# Altium schematic symbol library jlcpcb_2025_04_capacitors_extended_0402.schlib: 3594 symbols (part 19 of 20) (continued)
## UMK105CG471JVHF
designator C?  Capacitance: 470pF  (hidden comment: *)
Capacitor, Ceramic (MLCC), 470pF, ±5%, 50V, C0G, ±5%, SMD 0402; Manufacturer: Taiyo Yuden; Manufacturer Part Number: UMK105CG471JVHF; Package Size: 0402; JLCPCB Basic Part: No; JLCPCB Part Number: C650946; Supplier 1: LCSC; Category: Capacitors - MLCC; Supplier Part Number 1: C650946; Tolerance: ±5%; Voltage Rating: 50V; Temperature Coefficient: C0G; RoHS: Yes; ComponentLink1Description: Datasheet; ComponentLink1URL: https://wmsc.lcsc.com/wmsc/upload/file/pdf/v2/lcsc/2304140030_Taiyo-Yuden-UMK105CG471JVHF_C650946.pdf; ComponentLink2Description: JLCPCB Part URL; ComponentLink2URL: https://jlcpcb.com/partdetail/C650946; ComponentLink3Description: LCSC Part URL; ComponentLink3URL: https://lcsc.com/product-detail/Multilayer-Ceramic-Capacitors-MLCC---SMD-SMT_Taiyo-Yuden-Taiyo-Yuden-UMK105CG471JVHF_C650946.html
footprint CAP-0402 (0402 (1005M) Capacitor)
pins: 1, 2

## UMK105CG560JV-F
designator C?  Capacitance: 56pF  (hidden comment: *)
Capacitor, Ceramic (MLCC), 56pF, ±5%, 50V, C0G, ±5%, SMD 0402; Manufacturer: Taiyo Yuden; Manufacturer Part Number: UMK105CG560JV-F; Package Size: 0402; JLCPCB Basic Part: No; JLCPCB Part Number: C386143; Supplier 1: LCSC; Category: Capacitors - MLCC; Supplier Part Number 1: C386143; Tolerance: ±5%; Voltage Rating: 50V; Temperature Coefficient: C0G; RoHS: Yes; ComponentLink1Description: Datasheet; ComponentLink1URL: https://wmsc.lcsc.com/wmsc/upload/file/pdf/v2/lcsc/2304140030_Taiyo-Yuden-UMK105CG560JV-F_C386143.pdf; ComponentLink2Description: JLCPCB Part URL; ComponentLink2URL: https://jlcpcb.com/partdetail/C386143; ComponentLink3Description: LCSC Part URL; ComponentLink3URL: https://lcsc.com/product-detail/Multilayer-Ceramic-Capacitors-MLCC---SMD-SMT_Taiyo-Yuden-Taiyo-Yuden-UMK105CG560JV-F_C386143.html
footprint CAP-0402 (0402 (1005M) Capacitor)
pins: 1, 2

## UMK105CG561JVHF
designator C?  Capacitance: 560pF  (hidden comment: *)
Capacitor, Ceramic (MLCC), 560pF, ±5%, 50V, C0G, ±5%, SMD 0402; Manufacturer: Taiyo Yuden; Manufacturer Part Number: UMK105CG561JVHF; Package Size: 0402; JLCPCB Basic Part: No; JLCPCB Part Number: C2987844; Supplier 1: LCSC; Category: Capacitors - MLCC; Supplier Part Number 1: C2987844; Tolerance: ±5%; Voltage Rating: 50V; Temperature Coefficient: C0G; RoHS: Yes; ComponentLink1Description: Datasheet; ComponentLink1URL: https://wmsc.lcsc.com/wmsc/upload/file/pdf/v2/lcsc/2203311630_Taiyo-Yuden-UMK105CG561JVHF_C2987844.pdf; ComponentLink2Description: JLCPCB Part URL; ComponentLink2URL: https://jlcpcb.com/partdetail/C2987844; ComponentLink3Description: LCSC Part URL; ComponentLink3URL: https://lcsc.com/product-detail/Multilayer-Ceramic-Capacitors-MLCC---SMD-SMT_Taiyo-Yuden-Taiyo-Yuden-UMK105CG561JVHF_C2987844.html
footprint CAP-0402 (0402 (1005M) Capacitor)
pins: 1, 2

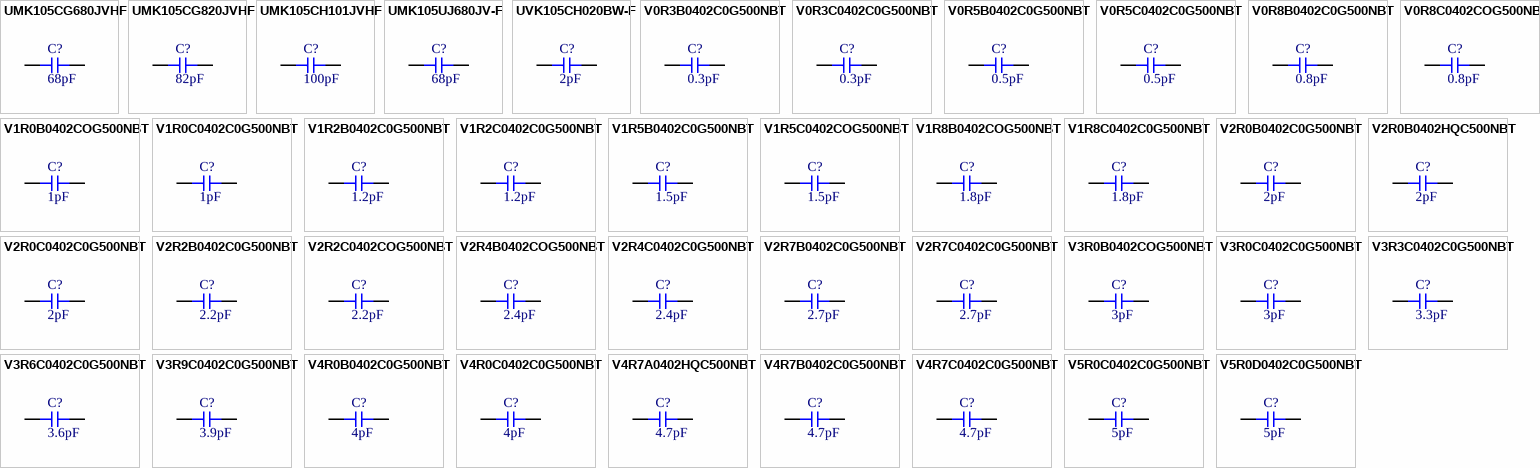
[diagram p87: symbols UMK105CG680JVHF to V5R0D0402C0G500NBT]

## UMK105CG680JVHF
designator C?  Capacitance: 68pF  (hidden comment: *)
Capacitor, Ceramic (MLCC), 68pF, ±5%, 50V, C0G, ±5%, SMD 0402; Manufacturer: Taiyo Yuden; Manufacturer Part Number: UMK105CG680JVHF; Package Size: 0402; JLCPCB Basic Part: No; JLCPCB Part Number: C2180891; Supplier 1: LCSC; Category: Capacitors - MLCC; Supplier Part Number 1: C2180891; Tolerance: ±5%; Voltage Rating: 50V; Temperature Coefficient: C0G; RoHS: Yes; ComponentLink1Description: Datasheet; ComponentLink1URL: https://wmsc.lcsc.com/wmsc/upload/file/pdf/v2/lcsc/2309051423_Taiyo-Yuden-UMK105CG680JVHF_C2180891.pdf; ComponentLink2Description: JLCPCB Part URL; ComponentLink2URL: https://jlcpcb.com/partdetail/C2180891; ComponentLink3Description: LCSC Part URL; ComponentLink3URL: https://lcsc.com/product-detail/Multilayer-Ceramic-Capacitors-MLCC---SMD-SMT_Taiyo-Yuden-Taiyo-Yuden-UMK105CG680JVHF_C2180891.html
footprint CAP-0402 (0402 (1005M) Capacitor)
pins: 1, 2

## UMK105CG820JVHF
designator C?  Capacitance: 82pF  (hidden comment: *)
Capacitor, Ceramic (MLCC), 82pF, ±5%, 50V, C0G, ±5%, SMD 0402; Manufacturer: Taiyo Yuden; Manufacturer Part Number: UMK105CG820JVHF; Package Size: 0402; JLCPCB Basic Part: No; JLCPCB Part Number: C650992; Supplier 1: LCSC; Category: Capacitors - MLCC; Supplier Part Number 1: C650992; Tolerance: ±5%; Voltage Rating: 50V; Temperature Coefficient: C0G; RoHS: Yes; ComponentLink1Description: Datasheet; ComponentLink1URL: https://wmsc.lcsc.com/wmsc/upload/file/pdf/v2/lcsc/2304140030_Taiyo-Yuden-UMK105CG820JVHF_C650992.pdf; ComponentLink2Description: JLCPCB Part URL; ComponentLink2URL: https://jlcpcb.com/partdetail/C650992; ComponentLink3Description: LCSC Part URL; ComponentLink3URL: https://lcsc.com/product-detail/Multilayer-Ceramic-Capacitors-MLCC---SMD-SMT_Taiyo-Yuden-Taiyo-Yuden-UMK105CG820JVHF_C650992.html
footprint CAP-0402 (0402 (1005M) Capacitor)
pins: 1, 2

## UMK105CH101JVHF
designator C?  Capacitance: 100pF  (hidden comment: *)
Capacitor, Ceramic (MLCC), 100pF, ±5%, 50V, ±5%, SMD 0402; Manufacturer: Taiyo Yuden; Manufacturer Part Number: UMK105CH101JVHF; Package Size: 0402; JLCPCB Basic Part: No; JLCPCB Part Number: C386148; Supplier 1: LCSC; Category: Capacitors - MLCC; Supplier Part Number 1: C386148; Tolerance: ±5%; Voltage Rating: 50V; RoHS: Yes; ComponentLink1Description: Datasheet; ComponentLink1URL: https://wmsc.lcsc.com/wmsc/upload/file/pdf/v2/lcsc/2304140030_Taiyo-Yuden-UMK105CH101JVHF_C386148.pdf; ComponentLink2Description: JLCPCB Part URL; ComponentLink2URL: https://jlcpcb.com/partdetail/C386148; ComponentLink3Description: LCSC Part URL; ComponentLink3URL: https://lcsc.com/product-detail/Multilayer-Ceramic-Capacitors-MLCC---SMD-SMT_Taiyo-Yuden-Taiyo-Yuden-UMK105CH101JVHF_C386148.html
footprint CAP-0402 (0402 (1005M) Capacitor)
pins: 1, 2

## UMK105UJ680JV-F
designator C?  Capacitance: 68pF  (hidden comment: *)
Capacitor, Ceramic (MLCC), 68pF, ±5%, 50V, U2J, ±5%, SMD 0402; Manufacturer: Taiyo Yuden; Manufacturer Part Number: UMK105UJ680JV-F; Package Size: 0402; JLCPCB Basic Part: No; JLCPCB Part Number: C311714; Supplier 1: LCSC; Category: Capacitors - MLCC; Supplier Part Number 1: C311714; Tolerance: ±5%; Voltage Rating: 50V; Temperature Coefficient: U2J; RoHS: Yes; ComponentLink1Description: Datasheet; ComponentLink1URL: https://wmsc.lcsc.com/wmsc/upload/file/pdf/v2/lcsc/2304140030_Taiyo-Yuden-UMK105UJ680JV-F_C311714.pdf; ComponentLink2Description: JLCPCB Part URL; ComponentLink2URL: https://jlcpcb.com/partdetail/C311714; ComponentLink3Description: LCSC Part URL; ComponentLink3URL: https://lcsc.com/product-detail/Multilayer-Ceramic-Capacitors-MLCC---SMD-SMT_Taiyo-Yuden-Taiyo-Yuden-UMK105UJ680JV-F_C311714.html
footprint CAP-0402 (0402 (1005M) Capacitor)
pins: 1, 2

## UVK105CH020BW-F
designator C?  Capacitance: 2pF  (hidden comment: *)
Capacitor, Ceramic (MLCC), 2pF, 50V, C0H, SMD 0402; Manufacturer: Taiyo Yuden; Manufacturer Part Number: UVK105CH020BW-F; Package Size: 0402; JLCPCB Basic Part: No; JLCPCB Part Number: C454119; Supplier 1: LCSC; Category: Capacitors - MLCC; Supplier Part Number 1: C454119; Voltage Rating: 50V; Temperature Coefficient: C0H; RoHS: Yes; ComponentLink1Description: Datasheet; ComponentLink1URL: https://wmsc.lcsc.com/wmsc/upload/file/pdf/v2/lcsc/2211282230_Taiyo-Yuden-UVK105CH020BW-F_C454119.pdf; ComponentLink2Description: JLCPCB Part URL; ComponentLink2URL: https://jlcpcb.com/partdetail/C454119; ComponentLink3Description: LCSC Part URL; ComponentLink3URL: https://lcsc.com/product-detail/Multilayer-Ceramic-Capacitors-MLCC---SMD-SMT_Taiyo-Yuden-Taiyo-Yuden-UVK105CH020BW-F_C454119.html
footprint CAP-0402 (0402 (1005M) Capacitor)
pins: 1, 2

## V0R3B0402C0G500NBT
designator C?  Capacitance: 0.3pF  (hidden comment: *)
Capacitor, Ceramic (MLCC), 0.3pF, 50V, C0G, SMD 0402; Manufacturer: VIIYONG; Manufacturer Part Number: V0R3B0402C0G500NBT; Package Size: 0402; JLCPCB Basic Part: No; JLCPCB Part Number: C610035; Supplier 1: LCSC; Category: Capacitors - MLCC; Supplier Part Number 1: C610035; Voltage Rating: 50V; Temperature Coefficient: C0G; RoHS: Yes; ComponentLink1Description: Datasheet; ComponentLink1URL: https://wmsc.lcsc.com/wmsc/upload/file/pdf/v2/lcsc/2304140030_VIIYONG-V0R3B0402C0G500NBT_C610035.pdf; ComponentLink2Description: JLCPCB Part URL; ComponentLink2URL: https://jlcpcb.com/partdetail/C610035; ComponentLink3Description: LCSC Part URL; ComponentLink3URL: https://lcsc.com/product-detail/Multilayer-Ceramic-Capacitors-MLCC---SMD-SMT_VIIYONG-VIIYONG-V0R3B0402C0G500NBT_C610035.html
footprint CAP-0402 (0402 (1005M) Capacitor)
pins: 1, 2

## V0R3C0402C0G500NBT
designator C?  Capacitance: 0.3pF  (hidden comment: *)
Capacitor, Ceramic (MLCC), 0.3pF, 50V, C0G, SMD 0402; Manufacturer: VIIYONG; Manufacturer Part Number: V0R3C0402C0G500NBT; Package Size: 0402; JLCPCB Basic Part: No; JLCPCB Part Number: C610036; Supplier 1: LCSC; Category: Capacitors - MLCC; Supplier Part Number 1: C610036; Voltage Rating: 50V; Temperature Coefficient: C0G; RoHS: Yes; ComponentLink1Description: Datasheet; ComponentLink1URL: https://wmsc.lcsc.com/wmsc/upload/file/pdf/v2/lcsc/2304140030_VIIYONG-V0R3C0402C0G500NBT_C610036.pdf; ComponentLink2Description: JLCPCB Part URL; ComponentLink2URL: https://jlcpcb.com/partdetail/C610036; ComponentLink3Description: LCSC Part URL; ComponentLink3URL: https://lcsc.com/product-detail/Multilayer-Ceramic-Capacitors-MLCC---SMD-SMT_VIIYONG-VIIYONG-V0R3C0402C0G500NBT_C610036.html
footprint CAP-0402 (0402 (1005M) Capacitor)
pins: 1, 2

## V0R5B0402C0G500NBT
designator C?  Capacitance: 0.5pF  (hidden comment: *)
Capacitor, Ceramic (MLCC), 0.5pF, 50V, C0G, SMD 0402; Manufacturer: VIIYONG; Manufacturer Part Number: V0R5B0402C0G500NBT; Package Size: 0402; JLCPCB Basic Part: No; JLCPCB Part Number: C610041; Supplier 1: LCSC; Category: Capacitors - MLCC; Supplier Part Number 1: C610041; Voltage Rating: 50V; Temperature Coefficient: C0G; RoHS: Yes; ComponentLink1Description: Datasheet; ComponentLink1URL: https://wmsc.lcsc.com/wmsc/upload/file/pdf/v2/lcsc/2304140030_VIIYONG-V0R5B0402C0G500NBT_C610041.pdf; ComponentLink2Description: JLCPCB Part URL; ComponentLink2URL: https://jlcpcb.com/partdetail/C610041; ComponentLink3Description: LCSC Part URL; ComponentLink3URL: https://lcsc.com/product-detail/Multilayer-Ceramic-Capacitors-MLCC---SMD-SMT_VIIYONG-VIIYONG-V0R5B0402C0G500NBT_C610041.html
footprint CAP-0402 (0402 (1005M) Capacitor)
pins: 1, 2

## V0R5C0402C0G500NBT
designator C?  Capacitance: 0.5pF  (hidden comment: *)
Capacitor, Ceramic (MLCC), 0.5pF, 50V, C0G, SMD 0402; Manufacturer: VIIYONG; Manufacturer Part Number: V0R5C0402C0G500NBT; Package Size: 0402; JLCPCB Basic Part: No; JLCPCB Part Number: C610042; Supplier 1: LCSC; Category: Capacitors - MLCC; Supplier Part Number 1: C610042; Voltage Rating: 50V; Temperature Coefficient: C0G; RoHS: Yes; ComponentLink1Description: Datasheet; ComponentLink1URL: https://wmsc.lcsc.com/wmsc/upload/file/pdf/v2/lcsc/2304140030_VIIYONG-V0R5C0402C0G500NBT_C610042.pdf; ComponentLink2Description: JLCPCB Part URL; ComponentLink2URL: https://jlcpcb.com/partdetail/C610042; ComponentLink3Description: LCSC Part URL; ComponentLink3URL: https://lcsc.com/product-detail/Multilayer-Ceramic-Capacitors-MLCC---SMD-SMT_VIIYONG-VIIYONG-V0R5C0402C0G500NBT_C610042.html
footprint CAP-0402 (0402 (1005M) Capacitor)
pins: 1, 2

## V0R8B0402C0G500NBT
designator C?  Capacitance: 0.8pF  (hidden comment: *)
Capacitor, Ceramic (MLCC), 0.8pF, 50V, C0G, SMD 0402; Manufacturer: VIIYONG; Manufacturer Part Number: V0R8B0402C0G500NBT; Package Size: 0402; JLCPCB Basic Part: No; JLCPCB Part Number: C610047; Supplier 1: LCSC; Category: Capacitors - MLCC; Supplier Part Number 1: C610047; Voltage Rating: 50V; Temperature Coefficient: C0G; RoHS: Yes; ComponentLink1Description: Datasheet; ComponentLink1URL: https://wmsc.lcsc.com/wmsc/upload/file/pdf/v2/lcsc/2304140030_VIIYONG-V0R8B0402C0G500NBT_C610047.pdf; ComponentLink2Description: JLCPCB Part URL; ComponentLink2URL: https://jlcpcb.com/partdetail/C610047; ComponentLink3Description: LCSC Part URL; ComponentLink3URL: https://lcsc.com/product-detail/Multilayer-Ceramic-Capacitors-MLCC---SMD-SMT_VIIYONG-VIIYONG-V0R8B0402C0G500NBT_C610047.html
footprint CAP-0402 (0402 (1005M) Capacitor)
pins: 1, 2

## V0R8C0402COG500NBT
designator C?  Capacitance: 0.8pF  (hidden comment: *)
Capacitor, Ceramic (MLCC), 0.8pF, 50V, C0G, SMD 0402; Manufacturer: VIIYONG; Manufacturer Part Number: V0R8C0402COG500NBT; Package Size: 0402; JLCPCB Basic Part: No; JLCPCB Part Number: C609886; Supplier 1: LCSC; Category: Capacitors - MLCC; Supplier Part Number 1: C609886; Voltage Rating: 50V; Temperature Coefficient: C0G; RoHS: Yes; ComponentLink1Description: Datasheet; ComponentLink1URL: https://wmsc.lcsc.com/wmsc/upload/file/pdf/v2/lcsc/2304140030_VIIYONG-V0R8C0402COG500NBT_C609886.pdf; ComponentLink2Description: JLCPCB Part URL; ComponentLink2URL: https://jlcpcb.com/partdetail/C609886; ComponentLink3Description: LCSC Part URL; ComponentLink3URL: https://lcsc.com/product-detail/Multilayer-Ceramic-Capacitors-MLCC---SMD-SMT_VIIYONG-VIIYONG-V0R8C0402COG500NBT_C609886.html
footprint CAP-0402 (0402 (1005M) Capacitor)
pins: 1, 2

## V1R0B0402COG500NBT
designator C?  Capacitance: 1pF  (hidden comment: *)
Capacitor, Ceramic (MLCC), 1pF, 50V, C0G, SMD 0402; Manufacturer: VIIYONG; Manufacturer Part Number: V1R0B0402COG500NBT; Package Size: 0402; JLCPCB Basic Part: No; JLCPCB Part Number: C609876; Supplier 1: LCSC; Category: Capacitors - MLCC; Supplier Part Number 1: C609876; Voltage Rating: 50V; Temperature Coefficient: C0G; RoHS: Yes; ComponentLink1Description: Datasheet; ComponentLink1URL: https://wmsc.lcsc.com/wmsc/upload/file/pdf/v2/lcsc/2304140030_VIIYONG-V1R0B0402COG500NBT_C609876.pdf; ComponentLink2Description: JLCPCB Part URL; ComponentLink2URL: https://jlcpcb.com/partdetail/C609876; ComponentLink3Description: LCSC Part URL; ComponentLink3URL: https://lcsc.com/product-detail/Multilayer-Ceramic-Capacitors-MLCC---SMD-SMT_VIIYONG-VIIYONG-V1R0B0402COG500NBT_C609876.html
footprint CAP-0402 (0402 (1005M) Capacitor)
pins: 1, 2

## V1R0C0402C0G500NBT
designator C?  Capacitance: 1pF  (hidden comment: *)
Capacitor, Ceramic (MLCC), 1pF, 50V, C0G, SMD 0402; Manufacturer: VIIYONG; Manufacturer Part Number: V1R0C0402C0G500NBT; Package Size: 0402; JLCPCB Basic Part: No; JLCPCB Part Number: C513440; Supplier 1: LCSC; Category: Capacitors - MLCC; Supplier Part Number 1: C513440; Voltage Rating: 50V; Temperature Coefficient: C0G; RoHS: Yes; ComponentLink1Description: Datasheet; ComponentLink1URL: https://wmsc.lcsc.com/wmsc/upload/file/pdf/v2/lcsc/2304140030_VIIYONG-V1R0C0402C0G500NBT_C513440.pdf; ComponentLink2Description: JLCPCB Part URL; ComponentLink2URL: https://jlcpcb.com/partdetail/C513440; ComponentLink3Description: LCSC Part URL; ComponentLink3URL: https://lcsc.com/product-detail/Multilayer-Ceramic-Capacitors-MLCC---SMD-SMT_VIIYONG-VIIYONG-V1R0C0402C0G500NBT_C513440.html
footprint CAP-0402 (0402 (1005M) Capacitor)
pins: 1, 2

## V1R2B0402C0G500NBT
designator C?  Capacitance: 1.2pF  (hidden comment: *)
Capacitor, Ceramic (MLCC), 1.2pF, 50V, C0G, SMD 0402; Manufacturer: VIIYONG; Manufacturer Part Number: V1R2B0402C0G500NBT; Package Size: 0402; JLCPCB Basic Part: No; JLCPCB Part Number: C513431; Supplier 1: LCSC; Category: Capacitors - MLCC; Supplier Part Number 1: C513431; Voltage Rating: 50V; Temperature Coefficient: C0G; RoHS: Yes; ComponentLink1Description: Datasheet; ComponentLink1URL: https://wmsc.lcsc.com/wmsc/upload/file/pdf/v2/lcsc/2304140030_VIIYONG-V1R2B0402C0G500NBT_C513431.pdf; ComponentLink2Description: JLCPCB Part URL; ComponentLink2URL: https://jlcpcb.com/partdetail/C513431; ComponentLink3Description: LCSC Part URL; ComponentLink3URL: https://lcsc.com/product-detail/Multilayer-Ceramic-Capacitors-MLCC---SMD-SMT_VIIYONG-VIIYONG-V1R2B0402C0G500NBT_C513431.html
footprint CAP-0402 (0402 (1005M) Capacitor)
pins: 1, 2

## V1R2C0402C0G500NBT
designator C?  Capacitance: 1.2pF  (hidden comment: *)
Capacitor, Ceramic (MLCC), 1.2pF, 50V, C0G, SMD 0402; Manufacturer: VIIYONG; Manufacturer Part Number: V1R2C0402C0G500NBT; Package Size: 0402; JLCPCB Basic Part: No; JLCPCB Part Number: C610055; Supplier 1: LCSC; Category: Capacitors - MLCC; Supplier Part Number 1: C610055; Voltage Rating: 50V; Temperature Coefficient: C0G; RoHS: Yes; ComponentLink1Description: Datasheet; ComponentLink1URL: https://wmsc.lcsc.com/wmsc/upload/file/pdf/v2/lcsc/2304140030_VIIYONG-V1R2C0402C0G500NBT_C610055.pdf; ComponentLink2Description: JLCPCB Part URL; ComponentLink2URL: https://jlcpcb.com/partdetail/C610055; ComponentLink3Description: LCSC Part URL; ComponentLink3URL: https://lcsc.com/product-detail/Multilayer-Ceramic-Capacitors-MLCC---SMD-SMT_VIIYONG-VIIYONG-V1R2C0402C0G500NBT_C610055.html
footprint CAP-0402 (0402 (1005M) Capacitor)
pins: 1, 2

## V1R5B0402C0G500NBT
designator C?  Capacitance: 1.5pF  (hidden comment: *)
Capacitor, Ceramic (MLCC), 1.5pF, 50V, C0G, SMD 0402; Manufacturer: VIIYONG; Manufacturer Part Number: V1R5B0402C0G500NBT; Package Size: 0402; JLCPCB Basic Part: No; JLCPCB Part Number: C610057; Supplier 1: LCSC; Category: Capacitors - MLCC; Supplier Part Number 1: C610057; Voltage Rating: 50V; Temperature Coefficient: C0G; RoHS: Yes; ComponentLink1Description: Datasheet; ComponentLink1URL: https://wmsc.lcsc.com/wmsc/upload/file/pdf/v2/lcsc/2304140030_VIIYONG-V1R5B0402C0G500NBT_C610057.pdf; ComponentLink2Description: JLCPCB Part URL; ComponentLink2URL: https://jlcpcb.com/partdetail/C610057; ComponentLink3Description: LCSC Part URL; ComponentLink3URL: https://lcsc.com/product-detail/Multilayer-Ceramic-Capacitors-MLCC---SMD-SMT_VIIYONG-VIIYONG-V1R5B0402C0G500NBT_C610057.html
footprint CAP-0402 (0402 (1005M) Capacitor)
pins: 1, 2

## V1R5C0402COG500NBT
designator C?  Capacitance: 1.5pF  (hidden comment: *)
Capacitor, Ceramic (MLCC), 1.5pF, 50V, C0G, SMD 0402; Manufacturer: VIIYONG; Manufacturer Part Number: V1R5C0402COG500NBT; Package Size: 0402; JLCPCB Basic Part: No; JLCPCB Part Number: C609899; Supplier 1: LCSC; Category: Capacitors - MLCC; Supplier Part Number 1: C609899; Voltage Rating: 50V; Temperature Coefficient: C0G; RoHS: Yes; ComponentLink1Description: Datasheet; ComponentLink1URL: https://wmsc.lcsc.com/wmsc/upload/file/pdf/v2/lcsc/2304140030_VIIYONG-V1R5C0402COG500NBT_C609899.pdf; ComponentLink2Description: JLCPCB Part URL; ComponentLink2URL: https://jlcpcb.com/partdetail/C609899; ComponentLink3Description: LCSC Part URL; ComponentLink3URL: https://lcsc.com/product-detail/Multilayer-Ceramic-Capacitors-MLCC---SMD-SMT_VIIYONG-VIIYONG-V1R5C0402COG500NBT_C609899.html
footprint CAP-0402 (0402 (1005M) Capacitor)
pins: 1, 2

## V1R8B0402COG500NBT
designator C?  Capacitance: 1.8pF  (hidden comment: *)
Capacitor, Ceramic (MLCC), 1.8pF, 50V, C0G, SMD 0402; Manufacturer: VIIYONG; Manufacturer Part Number: V1R8B0402COG500NBT; Package Size: 0402; JLCPCB Basic Part: No; JLCPCB Part Number: C609898; Supplier 1: LCSC; Category: Capacitors - MLCC; Supplier Part Number 1: C609898; Voltage Rating: 50V; Temperature Coefficient: C0G; RoHS: Yes; ComponentLink1Description: Datasheet; ComponentLink1URL: https://wmsc.lcsc.com/wmsc/upload/file/pdf/v2/lcsc/2304140030_VIIYONG-V1R8B0402COG500NBT_C609898.pdf; ComponentLink2Description: JLCPCB Part URL; ComponentLink2URL: https://jlcpcb.com/partdetail/C609898; ComponentLink3Description: LCSC Part URL; ComponentLink3URL: https://lcsc.com/product-detail/Multilayer-Ceramic-Capacitors-MLCC---SMD-SMT_VIIYONG-VIIYONG-V1R8B0402COG500NBT_C609898.html
footprint CAP-0402 (0402 (1005M) Capacitor)
pins: 1, 2

## V1R8C0402C0G500NBT
designator C?  Capacitance: 1.8pF  (hidden comment: *)
Capacitor, Ceramic (MLCC), 1.8pF, 50V, C0G, SMD 0402; Manufacturer: VIIYONG; Manufacturer Part Number: V1R8C0402C0G500NBT; Package Size: 0402; JLCPCB Basic Part: No; JLCPCB Part Number: C513434; Supplier 1: LCSC; Category: Capacitors - MLCC; Supplier Part Number 1: C513434; Voltage Rating: 50V; Temperature Coefficient: C0G; RoHS: Yes; ComponentLink1Description: Datasheet; ComponentLink1URL: https://wmsc.lcsc.com/wmsc/upload/file/pdf/v2/lcsc/2304140030_VIIYONG-V1R8C0402C0G500NBT_C513434.pdf; ComponentLink2Description: JLCPCB Part URL; ComponentLink2URL: https://jlcpcb.com/partdetail/C513434; ComponentLink3Description: LCSC Part URL; ComponentLink3URL: https://lcsc.com/product-detail/Multilayer-Ceramic-Capacitors-MLCC---SMD-SMT_VIIYONG-VIIYONG-V1R8C0402C0G500NBT_C513434.html
footprint CAP-0402 (0402 (1005M) Capacitor)
pins: 1, 2

## V2R0B0402C0G500NBT
designator C?  Capacitance: 2pF  (hidden comment: *)
Capacitor, Ceramic (MLCC), 2pF, 50V, C0G, SMD 0402; Manufacturer: VIIYONG; Manufacturer Part Number: V2R0B0402C0G500NBT; Package Size: 0402; JLCPCB Basic Part: No; JLCPCB Part Number: C610061; Supplier 1: LCSC; Category: Capacitors - MLCC; Supplier Part Number 1: C610061; Voltage Rating: 50V; Temperature Coefficient: C0G; RoHS: Yes; ComponentLink1Description: Datasheet; ComponentLink1URL: https://wmsc.lcsc.com/wmsc/upload/file/pdf/v2/lcsc/2304140030_VIIYONG-V2R0B0402C0G500NBT_C610061.pdf; ComponentLink2Description: JLCPCB Part URL; ComponentLink2URL: https://jlcpcb.com/partdetail/C610061; ComponentLink3Description: LCSC Part URL; ComponentLink3URL: https://lcsc.com/product-detail/Multilayer-Ceramic-Capacitors-MLCC---SMD-SMT_VIIYONG-VIIYONG-V2R0B0402C0G500NBT_C610061.html
footprint CAP-0402 (0402 (1005M) Capacitor)
pins: 1, 2

## V2R0B0402HQC500NBT
designator C?  Capacitance: 2pF  (hidden comment: *)
Capacitor, Ceramic (MLCC), 2pF, 50V, SMD 0402; Manufacturer: VIIYONG; Manufacturer Part Number: V2R0B0402HQC500NBT; Package Size: 0402; JLCPCB Basic Part: No; JLCPCB Part Number: C2844461; Supplier 1: LCSC; Category: Capacitors - MLCC; Supplier Part Number 1: C2844461; Voltage Rating: 50V; RoHS: Yes; ComponentLink1Description: Datasheet; ComponentLink1URL: https://wmsc.lcsc.com/wmsc/upload/file/pdf/v2/lcsc/2202132030_VIIYONG-V2R0B0402HQC500NBT_C2844461.pdf; ComponentLink2Description: JLCPCB Part URL; ComponentLink2URL: https://jlcpcb.com/partdetail/C2844461; ComponentLink3Description: LCSC Part URL; ComponentLink3URL: https://lcsc.com/product-detail/Multilayer-Ceramic-Capacitors-MLCC---SMD-SMT_VIIYONG-VIIYONG-V2R0B0402HQC500NBT_C2844461.html
footprint CAP-0402 (0402 (1005M) Capacitor)
pins: 1, 2

## V2R0C0402C0G500NBT
designator C?  Capacitance: 2pF  (hidden comment: *)
Capacitor, Ceramic (MLCC), 2pF, 50V, C0G, SMD 0402; Manufacturer: VIIYONG; Manufacturer Part Number: V2R0C0402C0G500NBT; Package Size: 0402; JLCPCB Basic Part: No; JLCPCB Part Number: C610062; Supplier 1: LCSC; Category: Capacitors - MLCC; Supplier Part Number 1: C610062; Voltage Rating: 50V; Temperature Coefficient: C0G; RoHS: Yes; ComponentLink1Description: Datasheet; ComponentLink1URL: https://wmsc.lcsc.com/wmsc/upload/file/pdf/v2/lcsc/2304140030_VIIYONG-V2R0C0402C0G500NBT_C610062.pdf; ComponentLink2Description: JLCPCB Part URL; ComponentLink2URL: https://jlcpcb.com/partdetail/C610062; ComponentLink3Description: LCSC Part URL; ComponentLink3URL: https://lcsc.com/product-detail/Multilayer-Ceramic-Capacitors-MLCC---SMD-SMT_VIIYONG-VIIYONG-V2R0C0402C0G500NBT_C610062.html
footprint CAP-0402 (0402 (1005M) Capacitor)
pins: 1, 2

## V2R2B0402C0G500NBT
designator C?  Capacitance: 2.2pF  (hidden comment: *)
Capacitor, Ceramic (MLCC), 2.2pF, 50V, C0G, SMD 0402; Manufacturer: VIIYONG; Manufacturer Part Number: V2R2B0402C0G500NBT; Package Size: 0402; JLCPCB Basic Part: No; JLCPCB Part Number: C513441; Supplier 1: LCSC; Category: Capacitors - MLCC; Supplier Part Number 1: C513441; Voltage Rating: 50V; Temperature Coefficient: C0G; RoHS: Yes; ComponentLink1Description: Datasheet; ComponentLink1URL: https://wmsc.lcsc.com/wmsc/upload/file/pdf/v2/lcsc/2304140030_VIIYONG-V2R2B0402C0G500NBT_C513441.pdf; ComponentLink2Description: JLCPCB Part URL; ComponentLink2URL: https://jlcpcb.com/partdetail/C513441; ComponentLink3Description: LCSC Part URL; ComponentLink3URL: https://lcsc.com/product-detail/Multilayer-Ceramic-Capacitors-MLCC---SMD-SMT_VIIYONG-VIIYONG-V2R2B0402C0G500NBT_C513441.html
footprint CAP-0402 (0402 (1005M) Capacitor)
pins: 1, 2

## V2R2C0402COG500NBT
designator C?  Capacitance: 2.2pF  (hidden comment: *)
Capacitor, Ceramic (MLCC), 2.2pF, 50V, C0G, SMD 0402; Manufacturer: VIIYONG; Manufacturer Part Number: V2R2C0402COG500NBT; Package Size: 0402; JLCPCB Basic Part: No; JLCPCB Part Number: C609889; Supplier 1: LCSC; Category: Capacitors - MLCC; Supplier Part Number 1: C609889; Voltage Rating: 50V; Temperature Coefficient: C0G; RoHS: Yes; ComponentLink1Description: Datasheet; ComponentLink1URL: https://wmsc.lcsc.com/wmsc/upload/file/pdf/v2/lcsc/2304140030_VIIYONG-V2R2C0402COG500NBT_C609889.pdf; ComponentLink2Description: JLCPCB Part URL; ComponentLink2URL: https://jlcpcb.com/partdetail/C609889; ComponentLink3Description: LCSC Part URL; ComponentLink3URL: https://lcsc.com/product-detail/Multilayer-Ceramic-Capacitors-MLCC---SMD-SMT_VIIYONG-VIIYONG-V2R2C0402COG500NBT_C609889.html
footprint CAP-0402 (0402 (1005M) Capacitor)
pins: 1, 2

## V2R4B0402COG500NBT
designator C?  Capacitance: 2.4pF  (hidden comment: *)
Capacitor, Ceramic (MLCC), 2.4pF, 50V, C0G, SMD 0402; Manufacturer: VIIYONG; Manufacturer Part Number: V2R4B0402COG500NBT; Package Size: 0402; JLCPCB Basic Part: No; JLCPCB Part Number: C609891; Supplier 1: LCSC; Category: Capacitors - MLCC; Supplier Part Number 1: C609891; Voltage Rating: 50V; Temperature Coefficient: C0G; RoHS: Yes; ComponentLink1Description: Datasheet; ComponentLink1URL: https://wmsc.lcsc.com/wmsc/upload/file/pdf/v2/lcsc/2304140030_VIIYONG-V2R4B0402COG500NBT_C609891.pdf; ComponentLink2Description: JLCPCB Part URL; ComponentLink2URL: https://jlcpcb.com/partdetail/C609891; ComponentLink3Description: LCSC Part URL; ComponentLink3URL: https://lcsc.com/product-detail/Multilayer-Ceramic-Capacitors-MLCC---SMD-SMT_VIIYONG-VIIYONG-V2R4B0402COG500NBT_C609891.html
footprint CAP-0402 (0402 (1005M) Capacitor)
pins: 1, 2

## V2R4C0402C0G500NBT
designator C?  Capacitance: 2.4pF  (hidden comment: *)
Capacitor, Ceramic (MLCC), 2.4pF, 50V, C0G, SMD 0402; Manufacturer: VIIYONG; Manufacturer Part Number: V2R4C0402C0G500NBT; Package Size: 0402; JLCPCB Basic Part: No; JLCPCB Part Number: C610067; Supplier 1: LCSC; Category: Capacitors - MLCC; Supplier Part Number 1: C610067; Voltage Rating: 50V; Temperature Coefficient: C0G; RoHS: Yes; ComponentLink1Description: Datasheet; ComponentLink1URL: https://wmsc.lcsc.com/wmsc/upload/file/pdf/v2/lcsc/2304140030_VIIYONG-V2R4C0402C0G500NBT_C610067.pdf; ComponentLink2Description: JLCPCB Part URL; ComponentLink2URL: https://jlcpcb.com/partdetail/C610067; ComponentLink3Description: LCSC Part URL; ComponentLink3URL: https://lcsc.com/product-detail/Multilayer-Ceramic-Capacitors-MLCC---SMD-SMT_VIIYONG-VIIYONG-V2R4C0402C0G500NBT_C610067.html
footprint CAP-0402 (0402 (1005M) Capacitor)
pins: 1, 2

## V2R7B0402C0G500NBT
designator C?  Capacitance: 2.7pF  (hidden comment: *)
Capacitor, Ceramic (MLCC), 2.7pF, 50V, C0G, SMD 0402; Manufacturer: VIIYONG; Manufacturer Part Number: V2R7B0402C0G500NBT; Package Size: 0402; JLCPCB Basic Part: No; JLCPCB Part Number: C513442; Supplier 1: LCSC; Category: Capacitors - MLCC; Supplier Part Number 1: C513442; Voltage Rating: 50V; Temperature Coefficient: C0G; RoHS: Yes; ComponentLink1Description: Datasheet; ComponentLink1URL: https://wmsc.lcsc.com/wmsc/upload/file/pdf/v2/lcsc/2304140030_VIIYONG-V2R7B0402C0G500NBT_C513442.pdf; ComponentLink2Description: JLCPCB Part URL; ComponentLink2URL: https://jlcpcb.com/partdetail/C513442; ComponentLink3Description: LCSC Part URL; ComponentLink3URL: https://lcsc.com/product-detail/Multilayer-Ceramic-Capacitors-MLCC---SMD-SMT_VIIYONG-VIIYONG-V2R7B0402C0G500NBT_C513442.html
footprint CAP-0402 (0402 (1005M) Capacitor)
pins: 1, 2

## V2R7C0402C0G500NBT
designator C?  Capacitance: 2.7pF  (hidden comment: *)
Capacitor, Ceramic (MLCC), 2.7pF, 50V, C0G, SMD 0402; Manufacturer: VIIYONG; Manufacturer Part Number: V2R7C0402C0G500NBT; Package Size: 0402; JLCPCB Basic Part: No; JLCPCB Part Number: C513443; Supplier 1: LCSC; Category: Capacitors - MLCC; Supplier Part Number 1: C513443; Voltage Rating: 50V; Temperature Coefficient: C0G; RoHS: Yes; ComponentLink1Description: Datasheet; ComponentLink1URL: https://wmsc.lcsc.com/wmsc/upload/file/pdf/v2/lcsc/2304140030_VIIYONG-V2R7C0402C0G500NBT_C513443.pdf; ComponentLink2Description: JLCPCB Part URL; ComponentLink2URL: https://jlcpcb.com/partdetail/C513443; ComponentLink3Description: LCSC Part URL; ComponentLink3URL: https://lcsc.com/product-detail/Multilayer-Ceramic-Capacitors-MLCC---SMD-SMT_VIIYONG-VIIYONG-V2R7C0402C0G500NBT_C513443.html
footprint CAP-0402 (0402 (1005M) Capacitor)
pins: 1, 2

## V3R0B0402COG500NBT
designator C?  Capacitance: 3pF  (hidden comment: *)
Capacitor, Ceramic (MLCC), 3pF, 50V, C0G, SMD 0402; Manufacturer: VIIYONG; Manufacturer Part Number: V3R0B0402COG500NBT; Package Size: 0402; JLCPCB Basic Part: No; JLCPCB Part Number: C609877; Supplier 1: LCSC; Category: Capacitors - MLCC; Supplier Part Number 1: C609877; Voltage Rating: 50V; Temperature Coefficient: C0G; RoHS: Yes; ComponentLink1Description: Datasheet; ComponentLink1URL: https://wmsc.lcsc.com/wmsc/upload/file/pdf/v2/lcsc/2304140030_VIIYONG-V3R0B0402COG500NBT_C609877.pdf; ComponentLink2Description: JLCPCB Part URL; ComponentLink2URL: https://jlcpcb.com/partdetail/C609877; ComponentLink3Description: LCSC Part URL; ComponentLink3URL: https://lcsc.com/product-detail/Multilayer-Ceramic-Capacitors-MLCC---SMD-SMT_VIIYONG-VIIYONG-V3R0B0402COG500NBT_C609877.html
footprint CAP-0402 (0402 (1005M) Capacitor)
pins: 1, 2

## V3R0C0402C0G500NBT
designator C?  Capacitance: 3pF  (hidden comment: *)
Capacitor, Ceramic (MLCC), 3pF, 50V, C0G, SMD 0402; Manufacturer: VIIYONG; Manufacturer Part Number: V3R0C0402C0G500NBT; Package Size: 0402; JLCPCB Basic Part: No; JLCPCB Part Number: C610071; Supplier 1: LCSC; Category: Capacitors - MLCC; Supplier Part Number 1: C610071; Voltage Rating: 50V; Temperature Coefficient: C0G; RoHS: Yes; ComponentLink1Description: Datasheet; ComponentLink1URL: https://wmsc.lcsc.com/wmsc/upload/file/pdf/v2/lcsc/2304140030_VIIYONG-V3R0C0402C0G500NBT_C610071.pdf; ComponentLink2Description: JLCPCB Part URL; ComponentLink2URL: https://jlcpcb.com/partdetail/C610071; ComponentLink3Description: LCSC Part URL; ComponentLink3URL: https://lcsc.com/product-detail/Multilayer-Ceramic-Capacitors-MLCC---SMD-SMT_VIIYONG-VIIYONG-V3R0C0402C0G500NBT_C610071.html
footprint CAP-0402 (0402 (1005M) Capacitor)
pins: 1, 2

## V3R3C0402C0G500NBT
designator C?  Capacitance: 3.3pF  (hidden comment: *)
Capacitor, Ceramic (MLCC), 3.3pF, 50V, SMD 0402; Manufacturer: VIIYONG; Manufacturer Part Number: V3R3C0402C0G500NBT; Package Size: 0402; JLCPCB Basic Part: No; JLCPCB Part Number: C962112; Supplier 1: LCSC; Category: Capacitors - MLCC; Supplier Part Number 1: C962112; Voltage Rating: 50V; RoHS: Yes; ComponentLink1Description: Datasheet; ComponentLink1URL: https://wmsc.lcsc.com/wmsc/upload/file/pdf/v2/lcsc/2304140030_VIIYONG-V3R3C0402C0G500NBT_C962112.pdf; ComponentLink2Description: JLCPCB Part URL; ComponentLink2URL: https://jlcpcb.com/partdetail/C962112; ComponentLink3Description: LCSC Part URL; ComponentLink3URL: https://lcsc.com/product-detail/Multilayer-Ceramic-Capacitors-MLCC---SMD-SMT_VIIYONG-VIIYONG-V3R3C0402C0G500NBT_C962112.html
footprint CAP-0402 (0402 (1005M) Capacitor)
pins: 1, 2

## V3R6C0402C0G500NBT
designator C?  Capacitance: 3.6pF  (hidden comment: *)
Capacitor, Ceramic (MLCC), 3.6pF, 50V, C0G, SMD 0402; Manufacturer: VIIYONG; Manufacturer Part Number: V3R6C0402C0G500NBT; Package Size: 0402; JLCPCB Basic Part: No; JLCPCB Part Number: C610074; Supplier 1: LCSC; Category: Capacitors - MLCC; Supplier Part Number 1: C610074; Voltage Rating: 50V; Temperature Coefficient: C0G; RoHS: Yes; ComponentLink1Description: Datasheet; ComponentLink1URL: https://wmsc.lcsc.com/wmsc/upload/file/pdf/v2/lcsc/2304140030_VIIYONG-V3R6C0402C0G500NBT_C610074.pdf; ComponentLink2Description: JLCPCB Part URL; ComponentLink2URL: https://jlcpcb.com/partdetail/C610074; ComponentLink3Description: LCSC Part URL; ComponentLink3URL: https://lcsc.com/product-detail/Multilayer-Ceramic-Capacitors-MLCC---SMD-SMT_VIIYONG-VIIYONG-V3R6C0402C0G500NBT_C610074.html
footprint CAP-0402 (0402 (1005M) Capacitor)
pins: 1, 2

## V3R9C0402C0G500NBT
designator C?  Capacitance: 3.9pF  (hidden comment: *)
Capacitor, Ceramic (MLCC), 3.9pF, 50V, C0G, SMD 0402; Manufacturer: VIIYONG; Manufacturer Part Number: V3R9C0402C0G500NBT; Package Size: 0402; JLCPCB Basic Part: No; JLCPCB Part Number: C610077; Supplier 1: LCSC; Category: Capacitors - MLCC; Supplier Part Number 1: C610077; Voltage Rating: 50V; Temperature Coefficient: C0G; RoHS: Yes; ComponentLink1Description: Datasheet; ComponentLink1URL: https://wmsc.lcsc.com/wmsc/upload/file/pdf/v2/lcsc/2304140030_VIIYONG-V3R9C0402C0G500NBT_C610077.pdf; ComponentLink2Description: JLCPCB Part URL; ComponentLink2URL: https://jlcpcb.com/partdetail/C610077; ComponentLink3Description: LCSC Part URL; ComponentLink3URL: https://lcsc.com/product-detail/Multilayer-Ceramic-Capacitors-MLCC---SMD-SMT_VIIYONG-VIIYONG-V3R9C0402C0G500NBT_C610077.html
footprint CAP-0402 (0402 (1005M) Capacitor)
pins: 1, 2

## V4R0B0402C0G500NBT
designator C?  Capacitance: 4pF  (hidden comment: *)
Capacitor, Ceramic (MLCC), 4pF, 50V, C0G, SMD 0402; Manufacturer: VIIYONG; Manufacturer Part Number: V4R0B0402C0G500NBT; Package Size: 0402; JLCPCB Basic Part: No; JLCPCB Part Number: C610079; Supplier 1: LCSC; Category: Capacitors - MLCC; Supplier Part Number 1: C610079; Voltage Rating: 50V; Temperature Coefficient: C0G; RoHS: Yes; ComponentLink1Description: Datasheet; ComponentLink1URL: https://wmsc.lcsc.com/wmsc/upload/file/pdf/v2/lcsc/2304140030_VIIYONG-V4R0B0402C0G500NBT_C610079.pdf; ComponentLink2Description: JLCPCB Part URL; ComponentLink2URL: https://jlcpcb.com/partdetail/C610079; ComponentLink3Description: LCSC Part URL; ComponentLink3URL: https://lcsc.com/product-detail/Multilayer-Ceramic-Capacitors-MLCC---SMD-SMT_VIIYONG-VIIYONG-V4R0B0402C0G500NBT_C610079.html
footprint CAP-0402 (0402 (1005M) Capacitor)
pins: 1, 2

## V4R0C0402C0G500NBT
designator C?  Capacitance: 4pF  (hidden comment: *)
Capacitor, Ceramic (MLCC), 4pF, 50V, C0G, SMD 0402; Manufacturer: VIIYONG; Manufacturer Part Number: V4R0C0402C0G500NBT; Package Size: 0402; JLCPCB Basic Part: No; JLCPCB Part Number: C610080; Supplier 1: LCSC; Category: Capacitors - MLCC; Supplier Part Number 1: C610080; Voltage Rating: 50V; Temperature Coefficient: C0G; RoHS: Yes; ComponentLink1Description: Datasheet; ComponentLink1URL: https://wmsc.lcsc.com/wmsc/upload/file/pdf/v2/lcsc/2304140030_VIIYONG-V4R0C0402C0G500NBT_C610080.pdf; ComponentLink2Description: JLCPCB Part URL; ComponentLink2URL: https://jlcpcb.com/partdetail/C610080; ComponentLink3Description: LCSC Part URL; ComponentLink3URL: https://lcsc.com/product-detail/Multilayer-Ceramic-Capacitors-MLCC---SMD-SMT_VIIYONG-VIIYONG-V4R0C0402C0G500NBT_C610080.html
footprint CAP-0402 (0402 (1005M) Capacitor)
pins: 1, 2

## V4R7A0402HQC500NBT
designator C?  Capacitance: 4.7pF  (hidden comment: *)
Capacitor, Ceramic (MLCC), 4.7pF, 50V, C0G, SMD 0402; Manufacturer: VIIYONG; Manufacturer Part Number: V4R7A0402HQC500NBT; Package Size: 0402; JLCPCB Basic Part: No; JLCPCB Part Number: C5252422; Supplier 1: LCSC; Category: Capacitors - MLCC; Supplier Part Number 1: C5252422; Voltage Rating: 50V; Temperature Coefficient: C0G; RoHS: Yes; ComponentLink1Description: Datasheet; ComponentLink1URL: https://wmsc.lcsc.com/wmsc/upload/file/pdf/v2/lcsc/2211101800_VIIYONG-V4R7A0402HQC500NBT_C5252422.pdf; ComponentLink2Description: JLCPCB Part URL; ComponentLink2URL: https://jlcpcb.com/partdetail/C5252422; ComponentLink3Description: LCSC Part URL; ComponentLink3URL: https://lcsc.com/product-detail/Multilayer-Ceramic-Capacitors-MLCC---SMD-SMT_VIIYONG-VIIYONG-V4R7A0402HQC500NBT_C5252422.html
footprint CAP-0402 (0402 (1005M) Capacitor)
pins: 1, 2

## V4R7B0402C0G500NBT
designator C?  Capacitance: 4.7pF  (hidden comment: *)
Capacitor, Ceramic (MLCC), 4.7pF, 50V, C0G, SMD 0402; Manufacturer: VIIYONG; Manufacturer Part Number: V4R7B0402C0G500NBT; Package Size: 0402; JLCPCB Basic Part: No; JLCPCB Part Number: C513778; Supplier 1: LCSC; Category: Capacitors - MLCC; Supplier Part Number 1: C513778; Voltage Rating: 50V; Temperature Coefficient: C0G; RoHS: Yes; ComponentLink1Description: Datasheet; ComponentLink1URL: https://wmsc.lcsc.com/wmsc/upload/file/pdf/v2/lcsc/2304140030_VIIYONG-V4R7B0402C0G500NBT_C513778.pdf; ComponentLink2Description: JLCPCB Part URL; ComponentLink2URL: https://jlcpcb.com/partdetail/C513778; ComponentLink3Description: LCSC Part URL; ComponentLink3URL: https://lcsc.com/product-detail/Multilayer-Ceramic-Capacitors-MLCC---SMD-SMT_VIIYONG-VIIYONG-V4R7B0402C0G500NBT_C513778.html
footprint CAP-0402 (0402 (1005M) Capacitor)
pins: 1, 2

## V4R7C0402C0G500NBT
designator C?  Capacitance: 4.7pF  (hidden comment: *)
Capacitor, Ceramic (MLCC), 4.7pF, 50V, C0G, SMD 0402; Manufacturer: VIIYONG; Manufacturer Part Number: V4R7C0402C0G500NBT; Package Size: 0402; JLCPCB Basic Part: No; JLCPCB Part Number: C610083; Supplier 1: LCSC; Category: Capacitors - MLCC; Supplier Part Number 1: C610083; Voltage Rating: 50V; Temperature Coefficient: C0G; RoHS: Yes; ComponentLink1Description: Datasheet; ComponentLink1URL: https://wmsc.lcsc.com/wmsc/upload/file/pdf/v2/lcsc/2304140030_VIIYONG-V4R7C0402C0G500NBT_C610083.pdf; ComponentLink2Description: JLCPCB Part URL; ComponentLink2URL: https://jlcpcb.com/partdetail/C610083; ComponentLink3Description: LCSC Part URL; ComponentLink3URL: https://lcsc.com/product-detail/Multilayer-Ceramic-Capacitors-MLCC---SMD-SMT_VIIYONG-VIIYONG-V4R7C0402C0G500NBT_C610083.html
footprint CAP-0402 (0402 (1005M) Capacitor)
pins: 1, 2

## V5R0C0402C0G500NBT
designator C?  Capacitance: 5pF  (hidden comment: *)
Capacitor, Ceramic (MLCC), 5pF, 50V, C0G, SMD 0402; Manufacturer: VIIYONG; Manufacturer Part Number: V5R0C0402C0G500NBT; Package Size: 0402; JLCPCB Basic Part: No; JLCPCB Part Number: C610085; Supplier 1: LCSC; Category: Capacitors - MLCC; Supplier Part Number 1: C610085; Voltage Rating: 50V; Temperature Coefficient: C0G; RoHS: Yes; ComponentLink1Description: Datasheet; ComponentLink1URL: https://wmsc.lcsc.com/wmsc/upload/file/pdf/v2/lcsc/2304140030_VIIYONG-V5R0C0402C0G500NBT_C610085.pdf; ComponentLink2Description: JLCPCB Part URL; ComponentLink2URL: https://jlcpcb.com/partdetail/C610085; ComponentLink3Description: LCSC Part URL; ComponentLink3URL: https://lcsc.com/product-detail/Multilayer-Ceramic-Capacitors-MLCC---SMD-SMT_VIIYONG-VIIYONG-V5R0C0402C0G500NBT_C610085.html
footprint CAP-0402 (0402 (1005M) Capacitor)
pins: 1, 2

## V5R0D0402C0G500NBT
designator C?  Capacitance: 5pF  (hidden comment: *)
Capacitor, Ceramic (MLCC), 5pF, 50V, C0G, SMD 0402; Manufacturer: VIIYONG; Manufacturer Part Number: V5R0D0402C0G500NBT; Package Size: 0402; JLCPCB Basic Part: No; JLCPCB Part Number: C610086; Supplier 1: LCSC; Category: Capacitors - MLCC; Supplier Part Number 1: C610086; Voltage Rating: 50V; Temperature Coefficient: C0G; RoHS: Yes; ComponentLink1Description: Datasheet; ComponentLink1URL: https://wmsc.lcsc.com/wmsc/upload/file/pdf/v2/lcsc/2304140030_VIIYONG-V5R0D0402C0G500NBT_C610086.pdf; ComponentLink2Description: JLCPCB Part URL; ComponentLink2URL: https://jlcpcb.com/partdetail/C610086; ComponentLink3Description: LCSC Part URL; ComponentLink3URL: https://lcsc.com/product-detail/Multilayer-Ceramic-Capacitors-MLCC---SMD-SMT_VIIYONG-VIIYONG-V5R0D0402C0G500NBT_C610086.html
footprint CAP-0402 (0402 (1005M) Capacitor)
pins: 1, 2

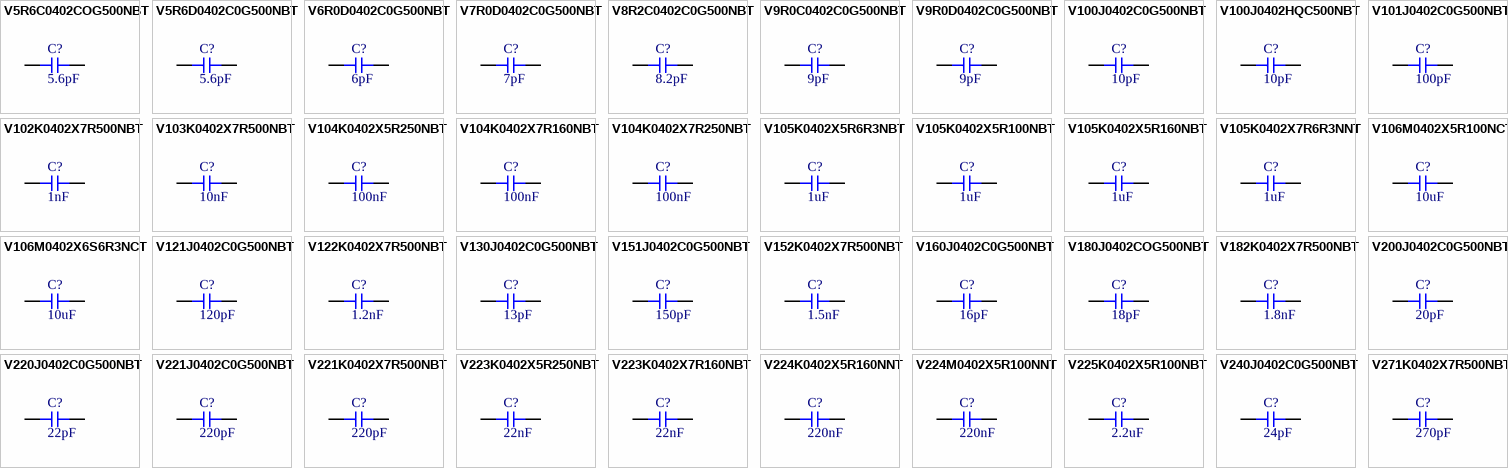
[diagram p88: symbols V5R6C0402COG500NBT to V271K0402X7R500NBT]

## V5R6C0402COG500NBT
designator C?  Capacitance: 5.6pF  (hidden comment: *)
Capacitor, Ceramic (MLCC), 5.6pF, 50V, C0G, SMD 0402; Manufacturer: VIIYONG; Manufacturer Part Number: V5R6C0402COG500NBT; Package Size: 0402; JLCPCB Basic Part: No; JLCPCB Part Number: C609881; Supplier 1: LCSC; Category: Capacitors - MLCC; Supplier Part Number 1: C609881; Voltage Rating: 50V; Temperature Coefficient: C0G; RoHS: Yes; ComponentLink1Description: Datasheet; ComponentLink1URL: https://wmsc.lcsc.com/wmsc/upload/file/pdf/v2/lcsc/2304140030_VIIYONG-V5R6C0402COG500NBT_C609881.pdf; ComponentLink2Description: JLCPCB Part URL; ComponentLink2URL: https://jlcpcb.com/partdetail/C609881; ComponentLink3Description: LCSC Part URL; ComponentLink3URL: https://lcsc.com/product-detail/Multilayer-Ceramic-Capacitors-MLCC---SMD-SMT_VIIYONG-VIIYONG-V5R6C0402COG500NBT_C609881.html
footprint CAP-0402 (0402 (1005M) Capacitor)
pins: 1, 2

## V5R6D0402C0G500NBT
designator C?  Capacitance: 5.6pF  (hidden comment: *)
Capacitor, Ceramic (MLCC), 5.6pF, 50V, C0G, SMD 0402; Manufacturer: VIIYONG; Manufacturer Part Number: V5R6D0402C0G500NBT; Package Size: 0402; JLCPCB Basic Part: No; JLCPCB Part Number: C513452; Supplier 1: LCSC; Category: Capacitors - MLCC; Supplier Part Number 1: C513452; Voltage Rating: 50V; Temperature Coefficient: C0G; RoHS: Yes; ComponentLink1Description: Datasheet; ComponentLink1URL: https://wmsc.lcsc.com/wmsc/upload/file/pdf/v2/lcsc/2304140030_VIIYONG-V5R6D0402C0G500NBT_C513452.pdf; ComponentLink2Description: JLCPCB Part URL; ComponentLink2URL: https://jlcpcb.com/partdetail/C513452; ComponentLink3Description: LCSC Part URL; ComponentLink3URL: https://lcsc.com/product-detail/Multilayer-Ceramic-Capacitors-MLCC---SMD-SMT_VIIYONG-VIIYONG-V5R6D0402C0G500NBT_C513452.html
footprint CAP-0402 (0402 (1005M) Capacitor)
pins: 1, 2

## V6R0D0402C0G500NBT
designator C?  Capacitance: 6pF  (hidden comment: *)
Capacitor, Ceramic (MLCC), 6pF, 50V, C0G, SMD 0402; Manufacturer: VIIYONG; Manufacturer Part Number: V6R0D0402C0G500NBT; Package Size: 0402; JLCPCB Basic Part: No; JLCPCB Part Number: C610094; Supplier 1: LCSC; Category: Capacitors - MLCC; Supplier Part Number 1: C610094; Voltage Rating: 50V; Temperature Coefficient: C0G; RoHS: Yes; ComponentLink1Description: Datasheet; ComponentLink1URL: https://wmsc.lcsc.com/wmsc/upload/file/pdf/v2/lcsc/2304140030_VIIYONG-V6R0D0402C0G500NBT_C610094.pdf; ComponentLink2Description: JLCPCB Part URL; ComponentLink2URL: https://jlcpcb.com/partdetail/C610094; ComponentLink3Description: LCSC Part URL; ComponentLink3URL: https://lcsc.com/product-detail/Multilayer-Ceramic-Capacitors-MLCC---SMD-SMT_VIIYONG-VIIYONG-V6R0D0402C0G500NBT_C610094.html
footprint CAP-0402 (0402 (1005M) Capacitor)
pins: 1, 2

## V7R0D0402C0G500NBT
designator C?  Capacitance: 7pF  (hidden comment: *)
Capacitor, Ceramic (MLCC), 7pF, 50V, C0G, SMD 0402; Manufacturer: VIIYONG; Manufacturer Part Number: V7R0D0402C0G500NBT; Package Size: 0402; JLCPCB Basic Part: No; JLCPCB Part Number: C610100; Supplier 1: LCSC; Category: Capacitors - MLCC; Supplier Part Number 1: C610100; Voltage Rating: 50V; Temperature Coefficient: C0G; RoHS: Yes; ComponentLink1Description: Datasheet; ComponentLink1URL: https://wmsc.lcsc.com/wmsc/upload/file/pdf/v2/lcsc/2304140030_VIIYONG-V7R0D0402C0G500NBT_C610100.pdf; ComponentLink2Description: JLCPCB Part URL; ComponentLink2URL: https://jlcpcb.com/partdetail/C610100; ComponentLink3Description: LCSC Part URL; ComponentLink3URL: https://lcsc.com/product-detail/Multilayer-Ceramic-Capacitors-MLCC---SMD-SMT_VIIYONG-VIIYONG-V7R0D0402C0G500NBT_C610100.html
footprint CAP-0402 (0402 (1005M) Capacitor)
pins: 1, 2

## V8R2C0402C0G500NBT
designator C?  Capacitance: 8.2pF  (hidden comment: *)
Capacitor, Ceramic (MLCC), 8.2pF, 50V, C0G, SMD 0402; Manufacturer: VIIYONG; Manufacturer Part Number: V8R2C0402C0G500NBT; Package Size: 0402; JLCPCB Basic Part: No; JLCPCB Part Number: C513455; Supplier 1: LCSC; Category: Capacitors - MLCC; Supplier Part Number 1: C513455; Voltage Rating: 50V; Temperature Coefficient: C0G; RoHS: Yes; ComponentLink1Description: Datasheet; ComponentLink1URL: https://wmsc.lcsc.com/wmsc/upload/file/pdf/v2/lcsc/2304140030_VIIYONG-V8R2C0402C0G500NBT_C513455.pdf; ComponentLink2Description: JLCPCB Part URL; ComponentLink2URL: https://jlcpcb.com/partdetail/C513455; ComponentLink3Description: LCSC Part URL; ComponentLink3URL: https://lcsc.com/product-detail/Multilayer-Ceramic-Capacitors-MLCC---SMD-SMT_VIIYONG-VIIYONG-V8R2C0402C0G500NBT_C513455.html
footprint CAP-0402 (0402 (1005M) Capacitor)
pins: 1, 2

## V9R0C0402C0G500NBT
designator C?  Capacitance: 9pF  (hidden comment: *)
Capacitor, Ceramic (MLCC), 9pF, 50V, C0G, SMD 0402; Manufacturer: VIIYONG; Manufacturer Part Number: V9R0C0402C0G500NBT; Package Size: 0402; JLCPCB Basic Part: No; JLCPCB Part Number: C513456; Supplier 1: LCSC; Category: Capacitors - MLCC; Supplier Part Number 1: C513456; Voltage Rating: 50V; Temperature Coefficient: C0G; RoHS: Yes; ComponentLink1Description: Datasheet; ComponentLink1URL: https://wmsc.lcsc.com/wmsc/upload/file/pdf/v2/lcsc/2304140030_VIIYONG-V9R0C0402C0G500NBT_C513456.pdf; ComponentLink2Description: JLCPCB Part URL; ComponentLink2URL: https://jlcpcb.com/partdetail/C513456; ComponentLink3Description: LCSC Part URL; ComponentLink3URL: https://lcsc.com/product-detail/Multilayer-Ceramic-Capacitors-MLCC---SMD-SMT_VIIYONG-VIIYONG-V9R0C0402C0G500NBT_C513456.html
footprint CAP-0402 (0402 (1005M) Capacitor)
pins: 1, 2